# Altium footprint library ACTION_Others.pcblib: 73 footprints (part 2 of 5)
Each footprint in its own frame and in the unit in brackets; x right, y up, seen from the top. Pads: shape width x height; smd on the part's side, far side on the other; paste and mask are expansions set on the pad; w line width, h text height; cw(c..) or ccw(c..) is an arc to the next point about the centre after c.
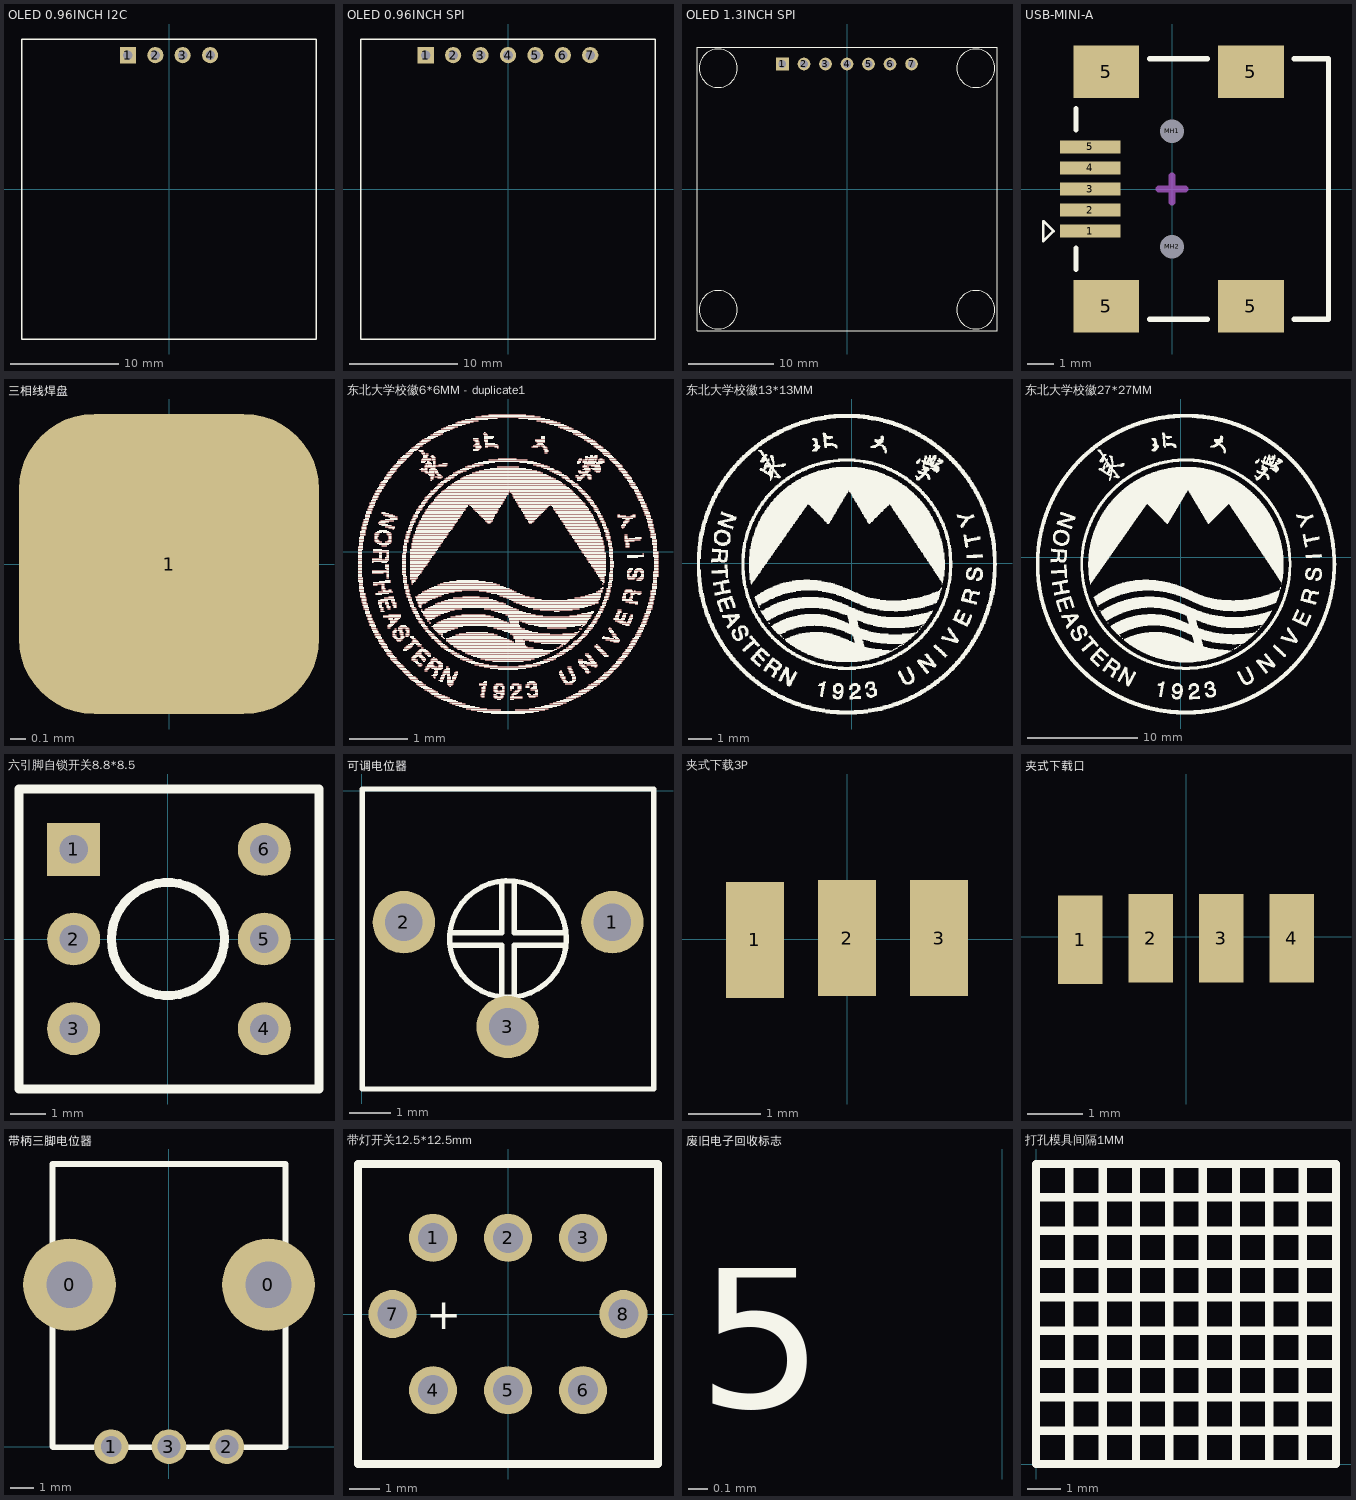
[diagram p1: the footprints below, top view; thin cyan lines are the x and y axes]

## OLED 0.96INCH I2C [mm]
pads (4):
  rect 1.5x1.5 hole 0.9: 1(-3.81,12.4)
  round 1.5 hole 0.9: 2(-1.27,12.4) 3(1.27,12.4) 4(3.81,12.4)
Top Overlay:
  lines w0.127: -13.65,-13.9 13.65,-13.9 13.65,13.9 -13.65,13.9 -13.65,-13.9
3D body "User Library-oled-1.STEP": height 2.7, standoff 0, extent -13.65,-13.9 13.65,13.9

## OLED 0.96INCH SPI [mm]
pads (7):
  rect 1.5x1.5 hole 0.9: 1(-7.62,12.4)
  round 1.5 hole 0.9: 2(-5.08,12.4) 3(-2.54,12.4) 4(0,12.4) 5(2.54,12.4) 6(5.08,12.4) 7(7.62,12.4)
Top Overlay:
  lines w0.127: -13.65,-13.9 13.65,-13.9 13.65,13.9 -13.65,13.9 -13.65,-13.9
3D body "User Library-oled-1.STEP": height 2.7, standoff 0, extent -13.65,-13.9 13.65,13.9

## OLED 1.3INCH SPI [mm]
pads (7):
  rect 1.5x1.5 hole 0.9: 1(-7.62,14.75)
  round 1.5 hole 0.9: 2(-5.08,14.75) 3(-2.54,14.75) 4(0,14.75) 5(2.54,14.75) 6(5.08,14.75) 7(7.62,14.75)
Top Overlay:
  circle w0.127: c-15.2,-14.25 r2.25
  circle w0.127: c15.2,-14.25 r2.25
  circle w0.127: c15.2,14.25 r2.25
  circle w0.127: c-15.2,14.25 r2.25
  lines w0.127: -17.7,-16.75 -17.7,16.75 17.7,16.75 17.7,-16.75 -17.7,-16.75
3D body: height 4, standoff 4, extent -17.704,-16.764 17.704,16.713

## USB-MINI-A [mm] "MINI型USB，7.9*7.5*4.1mm"
pads (11):
  rect 2.3x0.5 smd: 1(-3.108,-1.6) 2(-3.108,-0.8) 3(-3.108,0) 4(-3.108,0.8) 5(-3.108,1.6)
  rect 2.5x2 smd: 5(-2.5,-4.45) 5(-2.5,4.45) 5(3,-4.45) 5(3,4.45)
  round 0.6 hole 0.9 unplated: MH1(0,2.2) MH2(0,-2.2)
Top Overlay:
  lines w0.1: -4.886,-1.981 -4.886,-1.219 -4.505,-1.6 -4.886,-1.981
  lines w0.2: -3.65,-3.05 -3.65,-2.25 ; -3.65,2.25 -3.65,3.05 ; -0.85,-4.95 1.35,-4.95 ; -0.85,4.95 1.35,4.95 ; 4.65,-4.95 5.95,-4.95 5.95,4.95 4.65,4.95
Mechanical 15:
  lines w0.254: -0.508,0 0.508,0 ; 0,-0.508 0,0.508
3D body "USB MINI B型 贴片-": height 3.95, standoff -0.7, extent -3.7,-4.75 6,4.75

## 三相线焊盘 [mm]
pads (1):
  rrect50% 2x2 smd: 1(0,0)

## 东北大学校徽6*6MM - duplicate1 [mm]
height 1.22
Top Layer:
  drawing of 1885 lines, arcs and shapes, not listed
Top Overlay:
  drawing of 1885 lines, arcs and shapes, not listed

## 东北大学校徽13*13MM [mm]
Top Overlay:
  drawing of 3824 lines, arcs and shapes, not listed

## 东北大学校徽27*27MM [mm]
Top Overlay:
  drawing of 8197 lines, arcs and shapes, not listed

## 六引脚自锁开关8.8*8.5 [mm]
pads (6):
  rect 1.5x1.5 hole 0.8: 1(-2.667,2.54)
  round 1.5 hole 0.8: 2(-2.667,0) 3(-2.667,-2.54) 4(2.733,-2.54) 5(2.733,0) 6(2.733,2.54)
Top Overlay:
  circle w0.254: c0,0 r1.6
  lines w0.254: -4.217,-4.25 4.283,-4.25 4.283,4.25 -4.217,4.25 -4.217,-4.25

## 可调电位器 [mm]
pads (3):
  round 1.5 hole 0.9: 1(6.02,-3.15) 2(1.016,-3.15) 3(3.505,-5.664)
Top Overlay:
  circle w0.127: c3.513,-3.554 r1.4
  lines w0.127: 2.121,-3.704 3.363,-3.704 3.363,-4.945 ; 2.121,-3.404 3.363,-3.404 3.363,-2.162 ; 3.663,-4.945 3.663,-3.704 4.905,-3.704 ; 3.663,-2.162 3.663,-3.404 4.905,-3.404 ; 0.013,-7.154 7.013,-7.154 7.013,0.046 0.013,0.046 0.013,-7.154
3D body: height 4.7, standoff 0, extent 0,-7.163 7.01,0.051
3D body: height 0.25, standoff 0, extent 0.457,-0.254 0.457,-0.254

## 夹式下载3P [mm]
pads (3):
  rect 0.8x1.6 smd: 1(-1.27,-0.013) 2(0,0.013) 3(1.27,0.013)

## 夹式下载口 [mm]
pads (4):
  rect 0.8x1.6 smd: 1(-1.905,-0.051) 2(-0.635,-0.025) 3(0.635,-0.025) 4(1.905,-0.025)

## 带柄三脚电位器 [mm] "【三脚B103变频器 电机调速器 操作面板调速旋钮开关 变频器电位器】https://m"
pads (5):
  round 4 hole 2 square: 0(-4.3,7) 0(4.3,7)
  round 1.5 hole 0.9: 1(-2.5,0)
  round 1.5 hole 1: 2(2.5,0) 3(0,0)
Top Overlay:
  lines w0.254: -5.029,0 -5.029,12.217 5.029,12.217 5.029,0.025 ; -5.022,-0.025 5.029,-0.025

## 带灯开关12.5*12.5mm [mm]
pads (8):
  round 1.6 hole 1: 1(-2.5,2.54) 2(0,2.54) 3(2.5,2.54) 4(-2.5,-2.54) 5(0,-2.54) 6(2.5,-2.54) 7(-3.85,0) 8(3.85,0)
Top Overlay:
  lines w0.254: -5,-5 5,-5 5,5 -5,5 -5,-5
  text "+" at -2.718,-0.508 h1.02
3D body: height 10.85, standoff 0, extent -5.017,-5.004 5.017,5.004

## 废旧电子回收标志 [mm]
Top Overlay:
  text "5" at -1.549,-2.565 h1.52

## 打孔模具间隔1MM [mm]
Top Overlay:
  lines w0.254: 0,1 9,1 ; 0,2 9,2 ; 0,3 9,3 ; 0,4 9,4 ; 0,5 9,5 ; 0,6 9,6 ; 0,7 9,7 ; 0,8 9,8 ; 1,0 1,9 ; 2,0 2,9 ; 3,0 3,9 ; 4,0 4,9 ; 5,0 5,9 ; 6,0 6,9 ; 7,0 7,9 ; 8,0 8,9 ; 0,0 0,9 9,9 9,0 0,0